# Altium schematic symbol library Analog Devices Data Converters Digital-to-Analog Converters.SchLib: 2231 symbols (part 132 of 135) (continued)
## DAC08EQ (continued)

## DAC08ES
designator U?
Single 8-Bit Multiplying Digital-to-Analog Converter with Universal Digital Logic Interface, 0 to +70 degC, R-16, Tube; Generic Part Number: DAC08; Manufacturer: Analog Devices; PartNumber: DAC08ES; # DAC Outputs: 1; Max V+: 18V; Op Pwr Diss: 33mW; Resolution (Bits): 8; Settling Time: 85ns; Single Supply: No; DatasheetVersion: Rev.C; PackageVersion: 060606-A; PackageReference: R-16; PackageDescription: 16-Lead Standard Small Outline Package [SOIC_N] Narrow Body; Supplier 1: Digi-Key; Supplier Part Number 1: DAC08ES-ND; Supplier 2: Mouser; Supplier Part Number 2: 584-DAC08ES; Packing: Tube; RoHS: N; Mounting Technology: Surface Mount; Code_JEDEC: MS-012-AC; ComponentLink1Description: Manufacturer URL; ComponentLink1URL: http://www.analog.com/en/index.html; ComponentLink2Description: Datasheet; ComponentLink2URL: http://www.analog.com/static/imported-files/data_sheets/DAC08.pdf; ComponentLink3Description: Package Specification; ComponentLink3URL: http://www.analog.com/static/imported-files/packages/PKG_PDF/SOIC_Narrow%20(R)/R_16.pdf; ComponentLink4Description: Product URL; ComponentLink4URL: http://www.analog.com/en/digital-to-analog-converters/da-converters/dac08/products/product.html
footprint R-16_N (SOIC, 16-Leads, Body 9.9x3.9mm, Pitch 1.27mm, IPC Medium Density)
footprint R-16_L (SOIC, 16-Leads, Body 9.9x3.9mm, Pitch 1.27mm, IPC High Density)
footprint R-16_M (SOIC, 16-Leads, Body 9.9x3.9mm, Pitch 1.27mm, IPC Low Density)
pins: 1 V+ (power), 2 VREF(+) (in), 3 VREF(-) (in), 4 COMP, 5 VLC (in), 6 ~{IOUT}, 7 V- (power), 8 IOUT (out), 9 B1(MSB) (in), 10 B2 (in), 11 B3 (in), 12 B4 (in), 13 B5 (in), 14 B6 (in), 15 B7 (in), 16 B8(LSB) (in)

## DAC08ESZ
designator U?
Single 8-Bit Multiplying Digital-to-Analog Converter with Universal Digital Logic Interface, 0 to +70 degC, R-16, Pb-Free, Tube; Generic Part Number: DAC08; Manufacturer: Analog Devices; PartNumber: DAC08ESZ; # DAC Outputs: 1; Max V+: 18V; Op Pwr Diss: 33mW; Resolution (Bits): 8; Settling Time: 85ns; Single Supply: No; DatasheetVersion: Rev.C; PackageVersion: 060606-A; PackageReference: R-16; PackageDescription: 16-Lead Standard Small Outline Package [SOIC_N] Narrow Body; Supplier 1: Digi-Key; Supplier Part Number 1: DAC08ESZ-ND; Supplier 2: Newark; Supplier Part Number 2: 59K7902; Supplier 3: Mouser; Supplier Part Number 3: 584-DAC08ESZ; Packing: Tube; RoHS: Y; Mounting Technology: Surface Mount; Code_JEDEC: MS-012-AC; ComponentLink1Description: Manufacturer URL; ComponentLink1URL: http://www.analog.com/en/index.html; ComponentLink2Description: Datasheet; ComponentLink2URL: http://www.analog.com/static/imported-files/data_sheets/DAC08.pdf; ComponentLink3Description: Package Specification; ComponentLink3URL: http://www.analog.com/static/imported-files/packages/PKG_PDF/SOIC_Narrow%20(R)/R_16.pdf; ComponentLink4Description: Product URL; ComponentLink4URL: http://www.analog.com/en/digital-to-analog-converters/da-converters/dac08/products/product.html
footprint R-16_N (SOIC, 16-Leads, Body 9.9x3.9mm, Pitch 1.27mm, IPC Medium Density)
footprint R-16_L (SOIC, 16-Leads, Body 9.9x3.9mm, Pitch 1.27mm, IPC High Density)
footprint R-16_M (SOIC, 16-Leads, Body 9.9x3.9mm, Pitch 1.27mm, IPC Low Density)
pins: 1 V+ (power), 2 VREF(+) (in), 3 VREF(-) (in), 4 COMP, 5 VLC (in), 6 ~{IOUT}, 7 V- (power), 8 IOUT (out), 9 B1(MSB) (in), 10 B2 (in), 11 B3 (in), 12 B4 (in), 13 B5 (in), 14 B6 (in), 15 B7 (in), 16 B8(LSB) (in)

## DAC08ESZ-REEL
designator U?
Single 8-Bit Multiplying Digital-to-Analog Converter with Universal Digital Logic Interface, 0 to +70 degC, R-16, Pb-Free, Reel; Generic Part Number: DAC08; Manufacturer: Analog Devices; PartNumber: DAC08ESZ-REEL; # DAC Outputs: 1; Max V+: 18V; Op Pwr Diss: 33mW; Resolution (Bits): 8; Settling Time: 85ns; Single Supply: No; DatasheetVersion: Rev.C; PackageVersion: 060606-A; PackageReference: R-16; PackageDescription: 16-Lead Standard Small Outline Package [SOIC_N] Narrow Body; Supplier 1: Digi-Key; Supplier Part Number 1: DAC08ESZ-REEL-ND; Supplier 2: Newark; Supplier Part Number 2: 59K7903; Supplier 3: Mouser; Supplier Part Number 3: 584-DAC08ESZ-R; Packing: Reel; RoHS: Y; Mounting Technology: Surface Mount; Code_JEDEC: MS-012-AC; ComponentLink1Description: Manufacturer URL; ComponentLink1URL: http://www.analog.com/en/index.html; ComponentLink2Description: Datasheet; ComponentLink2URL: http://www.analog.com/static/imported-files/data_sheets/DAC08.pdf; ComponentLink3Description: Package Specification; ComponentLink3URL: http://www.analog.com/static/imported-files/packages/PKG_PDF/SOIC_Narrow%20(R)/R_16.pdf; ComponentLink4Description: Product URL; ComponentLink4URL: http://www.analog.com/en/digital-to-analog-converters/da-converters/dac08/products/product.html
footprint R-16_N (SOIC, 16-Leads, Body 9.9x3.9mm, Pitch 1.27mm, IPC Medium Density)
footprint R-16_L (SOIC, 16-Leads, Body 9.9x3.9mm, Pitch 1.27mm, IPC High Density)
footprint R-16_M (SOIC, 16-Leads, Body 9.9x3.9mm, Pitch 1.27mm, IPC Low Density)
pins: 1 V+ (power), 2 VREF(+) (in), 3 VREF(-) (in), 4 COMP, 5 VLC (in), 6 ~{IOUT}, 7 V- (power), 8 IOUT (out), 9 B1(MSB) (in), 10 B2 (in), 11 B3 (in), 12 B4 (in), 13 B5 (in), 14 B6 (in), 15 B7 (in), 16 B8(LSB) (in)

## DAC08HQ
designator U?
Single 8-Bit Multiplying Digital-to-Analog Converter with Universal Digital Logic Interface, 0 to +70 degC, Q-16, Tube; Generic Part Number: DAC08; Manufacturer: Analog Devices; PartNumber: DAC08HQ; # DAC Outputs: 1; Max V+: 18V; Op Pwr Diss: 33mW; Resolution (Bits): 8; Settling Time: 85ns; Single Supply: No; DatasheetVersion: Rev.C; PackageVersion: 1996; PackageReference: Q-16; PackageDescription: DIP, 16-Pin, Skinny Dual In-line Package, 300mil Wide, Pitch 2.54 mm; Supplier 1: Digi-Key; Supplier Part Number 1: DAC08HQ-ND; Supplier 2: Newark; Supplier Part Number 2: 05F7959; Supplier 3: Mouser; Supplier Part Number 3: 584-DAC08HQ; Packing: Tube; RoHS: N; Mounting Technology: Through Hole; ComponentLink1Description: Manufacturer URL; ComponentLink1URL: http://www.analog.com/en/index.html; ComponentLink2Description: Datasheet; ComponentLink2URL: http://www.analog.com/static/imported-files/data_sheets/DAC08.pdf; ComponentLink3Description: Package Specification; ComponentLink3URL: http://www.analog.com/static/imported-files/packages/54083157002221Q_16.pdf; ComponentLink4Description: Product URL; ComponentLink4URL: http://www.analog.com/en/digital-to-analog-converters/da-converters/dac08/products/product.html
footprint Q-16 (DIP, 16-Leads, Row Spacing 7.62mm, Pitch 2.54mm, Body 20.07x6.73mm)
pins: 1 VLC (in), 2 ~{IOUT}, 3 V- (power), 4 IOUT (out), 5 (MSB) B1 (in), 6 B2 (in), 7 B3 (in), 8 B4 (in), 9 B5 (in), 10 B6 (in), 11 B7 (in), 12 B8 (LSB) (in), 13 V+ (power), 14 VREF (+) (in), 15 VREF (-) (in), 16 COMP

## DAC08Q
designator U?
Single 8-Bit Multiplying Digital-to-Analog Converter with Universal Digital Logic Interface, -55 to +125 degC, Q-16, Tube; Generic Part Number: DAC08; Manufacturer: Analog Devices; PartNumber: DAC08Q; # DAC Outputs: 1; Max V+: 18V; Op Pwr Diss: 33mW; Resolution (Bits): 8; Settling Time: 85ns; Single Supply: No; DatasheetVersion: Rev.C; PackageVersion: 1996; PackageReference: Q-16; PackageDescription: DIP, 16-Pin, Skinny Dual In-line Package, 300mil Wide, Pitch 2.54 mm; Supplier 1: Digi-Key; Supplier Part Number 1: DAC08Q-ND; Supplier 2: Newark; Supplier Part Number 2: 09B8112; Supplier 3: Mouser; Supplier Part Number 3: 584-DAC08Q; Packing: Tube; RoHS: N; Mounting Technology: Through Hole; ComponentLink1Description: Manufacturer URL; ComponentLink1URL: http://www.analog.com/en/index.html; ComponentLink2Description: Datasheet; ComponentLink2URL: http://www.analog.com/static/imported-files/data_sheets/DAC08.pdf; ComponentLink3Description: Package Specification; ComponentLink3URL: http://www.analog.com/static/imported-files/packages/54083157002221Q_16.pdf; ComponentLink4Description: Product URL; ComponentLink4URL: http://www.analog.com/en/digital-to-analog-converters/da-converters/dac08/products/product.html
footprint Q-16 (DIP, 16-Leads, Row Spacing 7.62mm, Pitch 2.54mm, Body 20.07x6.73mm)
pins: 1 VLC (in), 2 ~{IOUT}, 3 V- (power), 4 IOUT (out), 5 (MSB) B1 (in), 6 B2 (in), 7 B3 (in), 8 B4 (in), 9 B5 (in), 10 B6 (in), 11 B7 (in), 12 B8 (LSB) (in), 13 V+ (power), 14 VREF (+) (in), 15 VREF (-) (in), 16 COMP

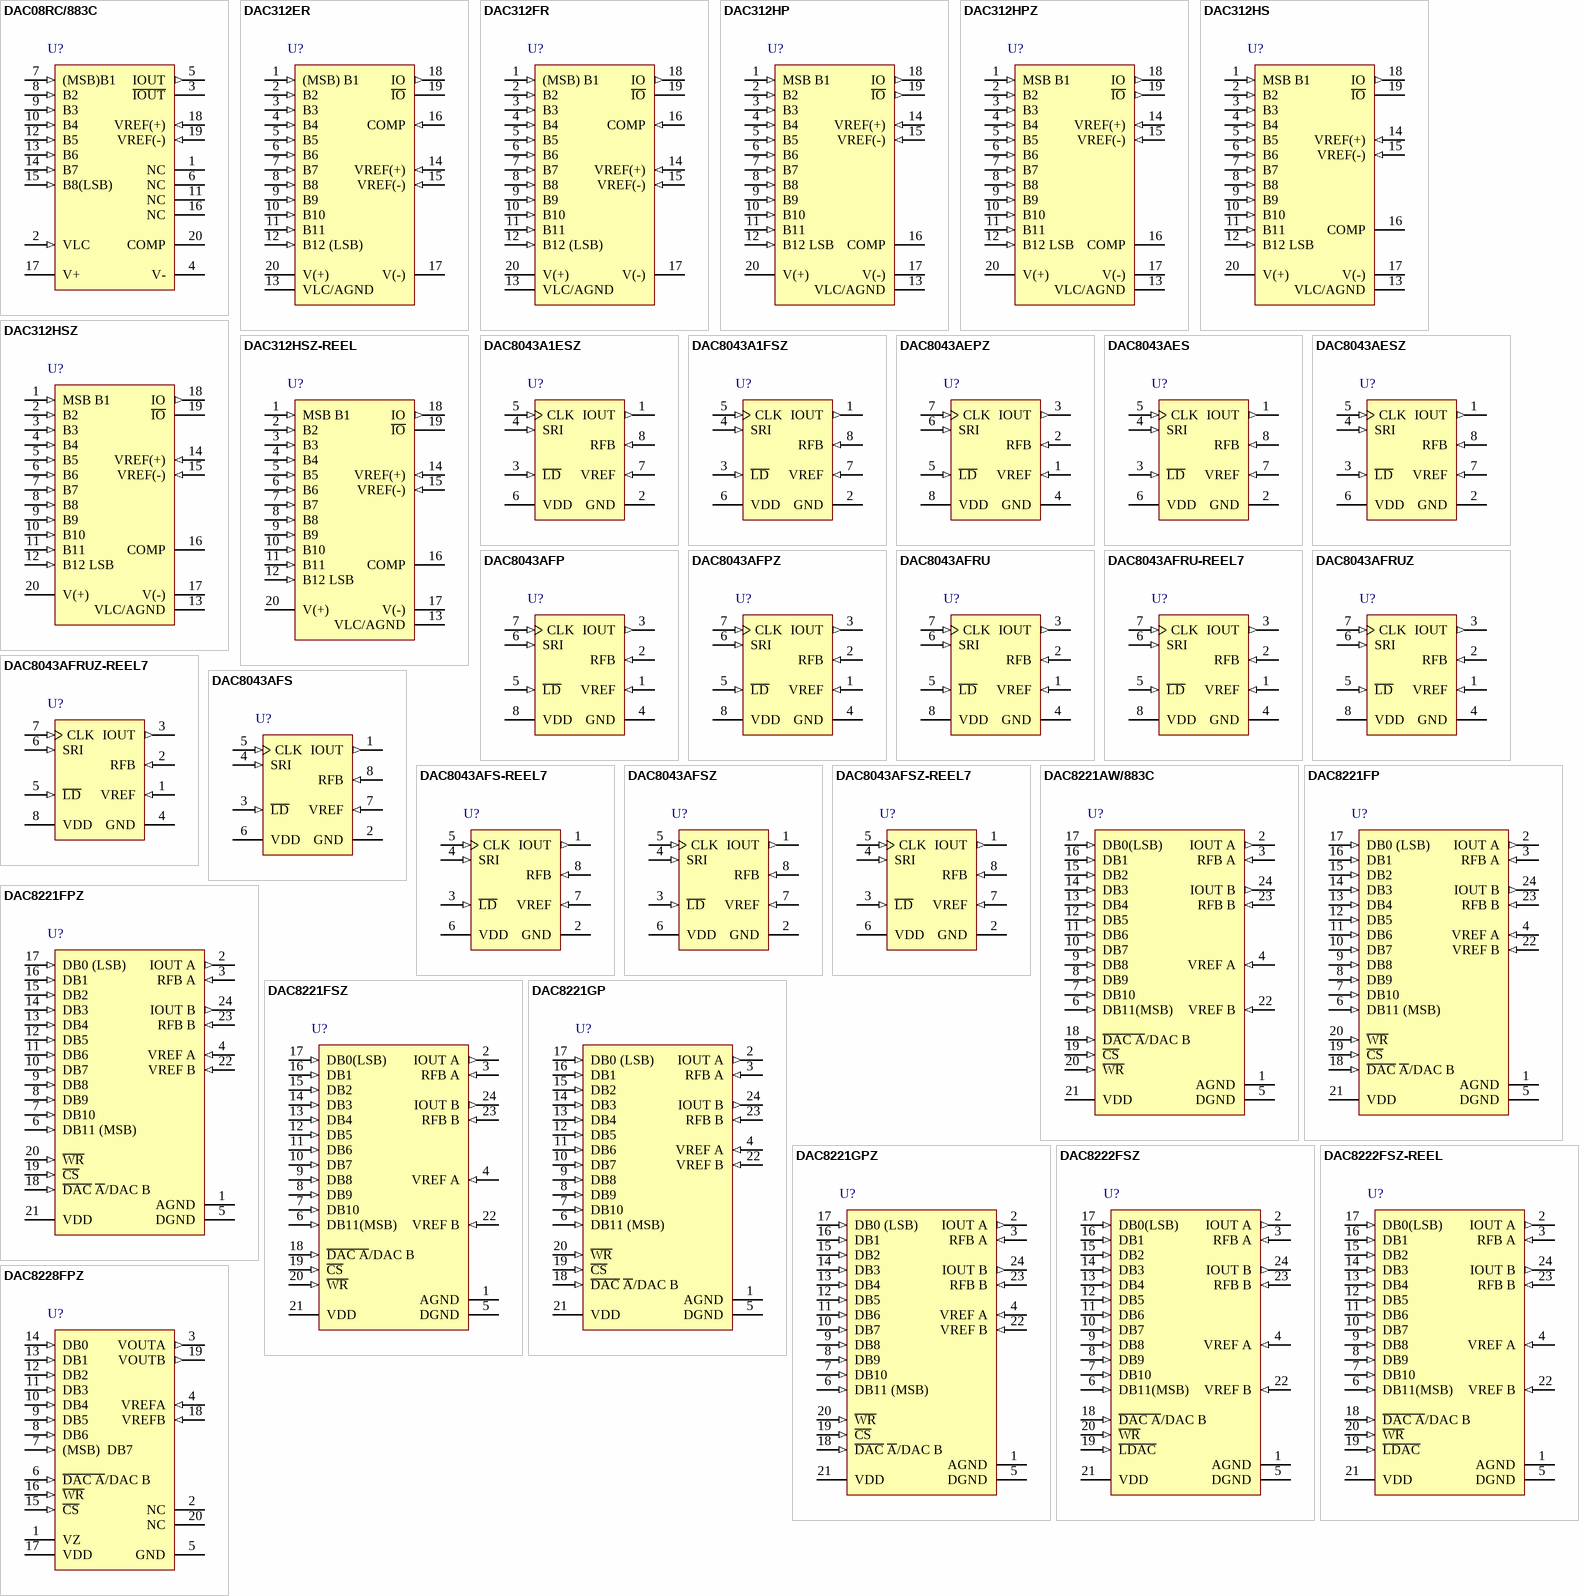
[diagram p110: symbols DAC08RC/883C to DAC8228FPZ]

## DAC08RC/883C
designator U?
Single 8-Bit Multiplying Digital-to-Analog Converter with Universal Digital Logic Interface, -55 to +125 degC, E-20-1, Tube; Generic Part Number: DAC08; Manufacturer: Analog Devices; PartNumber: DAC08RC/883C; # DAC Outputs: 1; Max V+: 18V; Op Pwr Diss: 33mW; Resolution (Bits): 8; Settling Time: 85ns; Single Supply: No; DatasheetVersion: Rev.C; PackageVersion: 022106-A; PackageReference: E-20-1; PackageDescription: 20-Terminal Ceramic Leadless Chip Carrier [LCC]; Supplier 1: Mouser; Supplier Part Number 1: 584-DAC08RC883C; Packing: Tube; RoHS: N; Mounting Technology: Surface Mount; ComponentLink1Description: Manufacturer URL; ComponentLink1URL: http://www.analog.com/en/index.html; ComponentLink2Description: Datasheet; ComponentLink2URL: http://www.analog.com/static/imported-files/data_sheets/DAC08.pdf; ComponentLink3Description: Package Specification; ComponentLink3URL: http://www.analog.com/static/imported-files/packages/PKG_PDF/LCC(E)/E_20_1.pdf; ComponentLink4Description: Product URL; ComponentLink4URL: http://www.analog.com/en/digital-to-analog-converters/da-converters/dac08/products/product.html
footprint E-20-1_N (Leadless Chip Carrier, 20-Leads, Body 8.9x8.9mm, Pitch 1.27mm, IPC Medium Density)
footprint E-20-1_L (Leadless Chip Carrier, 20-Leads, Body 8.9x8.9mm, Pitch 1.27mm, IPC High Density)
footprint E-20-1_M (Leadless Chip Carrier, 20-Leads, Body 8.9x8.9mm, Pitch 1.27mm, IPC Low Density)
pins: 1 NC, 2 VLC (in), 3 ~{IOUT}, 4 V- (power), 5 IOUT (out), 6 NC, 7 (MSB)B1 (in), 8 B2 (in), 9 B3 (in), 10 B4 (in), 11 NC, 12 B5 (in), 13 B6 (in), 14 B7 (in), 15 B8(LSB) (in), 16 NC, 17 V+ (power), 18 VREF(+) (in), 19 VREF(-) (in), 20 COMP

## DAC312ER
designator U?
Single 12-Bit High Speed Multiplying Digital-to-Analog Converter, 0 to +70 degC, Q-20, Tube; Generic Part Number: DAC312; Manufacturer: Analog Devices; PartNumber: DAC312ER; # DAC Outputs: 1; Max V+: 18V; Op Pwr Diss: 267mW; Resolution (Bits): 12; Settling Time: 250ns; Single Supply: No; DatasheetVersion: Rev.C; PackageVersion: Dec-2004; PackageReference: Q-20; PackageDescription: 20-Lead Ceramic Dual In-Line Package [CERDIP]; Supplier 1: Digi-Key; Supplier Part Number 1: DAC312ER-ND; Supplier 2: Mouser; Supplier Part Number 2: 584-DAC312ER; Packing: Tube; RoHS: N; Mounting Technology: Through Hole; ComponentLink1Description: Manufacturer URL; ComponentLink1URL: http://www.analog.com/en/index.html; ComponentLink2Description: Datasheet; ComponentLink2URL: http://www.analog.com/static/imported-files/data_sheets/DAC312.pdf; ComponentLink3Description: Package Specification; ComponentLink3URL: http://www.analog.com/static/imported-files/packages/50516416473314Q_20.pdf; ComponentLink4Description: Product URL; ComponentLink4URL: http://www.analog.com/en/digital-to-analog-converters/da-converters/dac312/products/product.html
footprint Q-20 (DIP, 20-Leads, Row Spacing 7.62mm, Pitch 2.54mm, Body 25.9x6.7mm)
pins: 1 (MSB) B1 (in), 2 B2 (in), 3 B3 (in), 4 B4 (in), 5 B5 (in), 6 B6 (in), 7 B7 (in), 8 B8 (in), 9 B9 (in), 10 B10 (in), 11 B11 (in), 12 B12 (LSB) (in), 13 VLC/AGND (power), 14 VREF(+) (in), 15 VREF(-) (in), 16 COMP (in), 17 V(-) (power), 18 IO (out), 19 ~{IO}, 20 V(+) (power)

## DAC312FR
designator U?
Single 12-Bit High Speed Multiplying Digital-to-Analog Converter, -40 to +85 degC, Q-20, Tube; Generic Part Number: DAC312; Manufacturer: Analog Devices; PartNumber: DAC312FR; # DAC Outputs: 1; Max V+: 18V; Op Pwr Diss: 267mW; Resolution (Bits): 12; Settling Time: 250ns; Single Supply: No; DatasheetVersion: Rev.C; PackageVersion: Dec-2004; PackageReference: Q-20; PackageDescription: 20-Lead Ceramic Dual In-Line Package [CERDIP]; Supplier 1: Digi-Key; Supplier Part Number 1: DAC312FR-ND; Supplier 2: Newark; Supplier Part Number 2: 05F7976; Supplier 3: Mouser; Supplier Part Number 3: 584-DAC312FR; Packing: Tube; RoHS: N; Mounting Technology: Through Hole; ComponentLink1Description: Manufacturer URL; ComponentLink1URL: http://www.analog.com/en/index.html; ComponentLink2Description: Datasheet; ComponentLink2URL: http://www.analog.com/static/imported-files/data_sheets/DAC312.pdf; ComponentLink3Description: Package Specification; ComponentLink3URL: http://www.analog.com/static/imported-files/packages/50516416473314Q_20.pdf; ComponentLink4Description: Product URL; ComponentLink4URL: http://www.analog.com/en/digital-to-analog-converters/da-converters/dac312/products/product.html
footprint Q-20 (DIP, 20-Leads, Row Spacing 7.62mm, Pitch 2.54mm, Body 25.9x6.7mm)
pins: 1 (MSB) B1 (in), 2 B2 (in), 3 B3 (in), 4 B4 (in), 5 B5 (in), 6 B6 (in), 7 B7 (in), 8 B8 (in), 9 B9 (in), 10 B10 (in), 11 B11 (in), 12 B12 (LSB) (in), 13 VLC/AGND (power), 14 VREF(+) (in), 15 VREF(-) (in), 16 COMP (in), 17 V(-) (power), 18 IO (out), 19 ~{IO}, 20 V(+) (power)

## DAC312HP
designator U?
Single 12-Bit Multiplying Digital-to-Analog Converter, -40 to +85 degC, N-20, Tube; Generic Part Number: DAC312; Manufacturer: Analog Devices; PartNumber: DAC312HP; # DAC Outputs: 1; Max V+: 18V; Op Pwr Diss: 267mW; Resolution (Bits): 12; Settling Time: 250ns; Single Supply: No; DatasheetVersion: Rev.C; PackageVersion: 070706-A; PackageReference: N-20; PackageDescription: 20-Lead Plastic Dual In-Line Package [PDIP] Narrow Body; Supplier 1: Digi-Key; Supplier Part Number 1: DAC312HP-ND; Supplier 2: Mouser; Supplier Part Number 2: 584-DAC312HP; Packing: Tube; RoHS: N; Mounting Technology: Through Hole; Code_JEDEC: MS-001; ComponentLink1Description: Manufacturer URL; ComponentLink1URL: http://www.analog.com/en/index.html; ComponentLink2Description: Datasheet; ComponentLink2URL: http://www.analog.com/static/imported-files/data_sheets/DAC312.pdf; ComponentLink3Description: Package Specification; ComponentLink3URL: http://www.analog.com/static/imported-files/packages/50601349676519N_20.pdf; ComponentLink4Description: Product URL; ComponentLink4URL: http://www.analog.com/en/digital-to-analog-converters/da-converters/dac312/products/product.html
footprint N-20 (DIP, 20-Leads, Row Spacing 7.62mm, Pitch 2.54mm, Body 25.9x6.6mm)
pins: 1 MSB B1 (in), 2 B2 (in), 3 B3 (in), 4 B4 (in), 5 B5 (in), 6 B6 (in), 7 B7 (in), 8 B8 (in), 9 B9 (in), 10 B10 (in), 11 B11 (in), 12 B12 LSB (in), 13 VLC/AGND (power), 14 VREF(+) (in), 15 VREF(-) (in), 16 COMP, 17 V(-) (power), 18 IO (out), 19 ~{IO} (out), 20 V(+) (power)

## DAC312HPZ
designator U?
Single 12-Bit Multiplying Digital-to-Analog Converter, -40 to +85 degC, N-20, Pb-Free, Tube; Generic Part Number: DAC312; Manufacturer: Analog Devices; PartNumber: DAC312HPZ; # DAC Outputs: 1; Max V+: 18V; Op Pwr Diss: 267mW; Resolution (Bits): 12; Settling Time: 250ns; Single Supply: No; DatasheetVersion: Rev.C; PackageVersion: 070706-A; PackageReference: N-20; PackageDescription: 20-Lead Plastic Dual In-Line Package [PDIP] Narrow Body; Supplier 1: Digi-Key; Supplier Part Number 1: DAC312HPZ-ND; Supplier 2: Newark; Supplier Part Number 2: 14M1925; Supplier 3: Mouser; Supplier Part Number 3: 584-DAC312HPZ; Packing: Tube; RoHS: Y; Mounting Technology: Through Hole; Code_JEDEC: MS-001; ComponentLink1Description: Manufacturer URL; ComponentLink1URL: http://www.analog.com/en/index.html; ComponentLink2Description: Datasheet; ComponentLink2URL: http://www.analog.com/static/imported-files/data_sheets/DAC312.pdf; ComponentLink3Description: Package Specification; ComponentLink3URL: http://www.analog.com/static/imported-files/packages/50601349676519N_20.pdf; ComponentLink4Description: Product URL; ComponentLink4URL: http://www.analog.com/en/digital-to-analog-converters/da-converters/dac312/products/product.html
footprint N-20 (DIP, 20-Leads, Row Spacing 7.62mm, Pitch 2.54mm, Body 25.9x6.6mm)
pins: 1 MSB B1 (in), 2 B2 (in), 3 B3 (in), 4 B4 (in), 5 B5 (in), 6 B6 (in), 7 B7 (in), 8 B8 (in), 9 B9 (in), 10 B10 (in), 11 B11 (in), 12 B12 LSB (in), 13 VLC/AGND (power), 14 VREF(+) (in), 15 VREF(-) (in), 16 COMP, 17 V(-) (power), 18 IO (out), 19 ~{IO} (out), 20 V(+) (power)

## DAC312HS
designator U?
Single 12-Bit Multiplying Digital-to-Analog Converter, -40 to +85 degC, RW-20, Tube; Generic Part Number: DAC312; Manufacturer: Analog Devices; PartNumber: DAC312HS; # DAC Outputs: 1; Max V+: 18V; Op Pwr Diss: 267mW; Resolution (Bits): 12; Settling Time: 250ns; Single Supply: No; DatasheetVersion: Rev.C; PackageVersion: 060706-A; PackageReference: RW-20; PackageDescription: 20-Lead Standard Small Outline Package [SOIC_W] Wide Body; Supplier 1: Digi-Key; Supplier Part Number 1: DAC312HS-ND; Supplier 2: Mouser; Supplier Part Number 2: 584-DAC312HS; Packing: Tube; RoHS: N; Mounting Technology: Surface Mount; Code_JEDEC: MS-013-AC; ComponentLink1Description: Manufacturer URL; ComponentLink1URL: http://www.analog.com/en/index.html; ComponentLink2Description: Datasheet; ComponentLink2URL: http://www.analog.com/static/imported-files/data_sheets/DAC312.pdf; ComponentLink3Description: Package Specification; ComponentLink3URL: http://www.analog.com/static/imported-files/packages/233848RW_20.pdf; ComponentLink4Description: Product URL; ComponentLink4URL: http://www.analog.com/en/digital-to-analog-converters/da-converters/dac312/products/product.html
footprint RW-20_N (SOIC, 20-Leads, Body 12.8x7.5mm, Pitch 1.27mm, IPC Medium Density)
footprint RW-20_L (SOIC, 20-Leads, Body 12.8x7.5mm, Pitch 1.27mm, IPC High Density)
footprint RW-20_M (SOIC, 20-Leads, Body 12.8x7.5mm, Pitch 1.27mm, IPC Low Density)
pins: 1 MSB B1 (in), 2 B2 (in), 3 B3 (in), 4 B4 (in), 5 B5 (in), 6 B6 (in), 7 B7 (in), 8 B8 (in), 9 B9 (in), 10 B10 (in), 11 B11 (in), 12 B12 LSB (in), 13 VLC/AGND (power), 14 VREF(+) (in), 15 VREF(-) (in), 16 COMP, 17 V(-) (power), 18 IO (out), 19 ~{IO}, 20 V(+) (power)

## DAC312HSZ
designator U?
Single 12-Bit Multiplying Digital-to-Analog Converter, -40 to +85 degC, RW-20, Pb-Free, Tube; Generic Part Number: DAC312; Manufacturer: Analog Devices; PartNumber: DAC312HSZ; # DAC Outputs: 1; Max V+: 18V; Op Pwr Diss: 267mW; Resolution (Bits): 12; Settling Time: 250ns; Single Supply: No; DatasheetVersion: Rev.C; PackageVersion: 060706-A; PackageReference: RW-20; PackageDescription: 20-Lead Standard Small Outline Package [SOIC_W] Wide Body; Supplier 1: Digi-Key; Supplier Part Number 1: DAC312HSZ-ND; Supplier 2: Newark; Supplier Part Number 2: 59K7909; Supplier 3: Mouser; Supplier Part Number 3: 584-DAC312HSZ; Packing: Tube; RoHS: Y; Mounting Technology: Surface Mount; Code_JEDEC: MS-013-AC; ComponentLink1Description: Manufacturer URL; ComponentLink1URL: http://www.analog.com/en/index.html; ComponentLink2Description: Datasheet; ComponentLink2URL: http://www.analog.com/static/imported-files/data_sheets/DAC312.pdf; ComponentLink3Description: Package Specification; ComponentLink3URL: http://www.analog.com/static/imported-files/packages/233848RW_20.pdf; ComponentLink4Description: Product URL; ComponentLink4URL: http://www.analog.com/en/digital-to-analog-converters/da-converters/dac312/products/product.html
footprint RW-20_N (SOIC, 20-Leads, Body 12.8x7.5mm, Pitch 1.27mm, IPC Medium Density)
footprint RW-20_L (SOIC, 20-Leads, Body 12.8x7.5mm, Pitch 1.27mm, IPC High Density)
footprint RW-20_M (SOIC, 20-Leads, Body 12.8x7.5mm, Pitch 1.27mm, IPC Low Density)
pins: 1 MSB B1 (in), 2 B2 (in), 3 B3 (in), 4 B4 (in), 5 B5 (in), 6 B6 (in), 7 B7 (in), 8 B8 (in), 9 B9 (in), 10 B10 (in), 11 B11 (in), 12 B12 LSB (in), 13 VLC/AGND (power), 14 VREF(+) (in), 15 VREF(-) (in), 16 COMP, 17 V(-) (power), 18 IO (out), 19 ~{IO}, 20 V(+) (power)

## DAC312HSZ-REEL
designator U?
Single 12-Bit Multiplying Digital-to-Analog Converter, 0 to +70 degC, RW-20, Pb-Free, Reel; Generic Part Number: DAC312; Manufacturer: Analog Devices; PartNumber: DAC312HSZ-REEL; # DAC Outputs: 1; Max V+: 18V; Op Pwr Diss: 267mW; Resolution (Bits): 12; Settling Time: 250ns; Single Supply: No; DatasheetVersion: Rev.C; PackageVersion: 060706-A; PackageReference: RW-20; PackageDescription: 20-Lead Standard Small Outline Package [SOIC_W] Wide Body; Supplier 1: Digi-Key; Supplier Part Number 1: DAC312HSZ-REEL-ND; Supplier 2: Mouser; Supplier Part Number 2: 584-DAC312HSZ-R; Packing: Reel; RoHS: Y; Mounting Technology: Surface Mount; Code_JEDEC: MS-013-AC; ComponentLink1Description: Manufacturer URL; ComponentLink1URL: http://www.analog.com/en/index.html; ComponentLink2Description: Datasheet; ComponentLink2URL: http://www.analog.com/static/imported-files/data_sheets/DAC312.pdf; ComponentLink3Description: Package Specification; ComponentLink3URL: http://www.analog.com/static/imported-files/packages/233848RW_20.pdf; ComponentLink4Description: Product URL; ComponentLink4URL: http://www.analog.com/en/digital-to-analog-converters/da-converters/dac312/products/product.html
footprint RW-20_N (SOIC, 20-Leads, Body 12.8x7.5mm, Pitch 1.27mm, IPC Medium Density)
footprint RW-20_L (SOIC, 20-Leads, Body 12.8x7.5mm, Pitch 1.27mm, IPC High Density)
footprint RW-20_M (SOIC, 20-Leads, Body 12.8x7.5mm, Pitch 1.27mm, IPC Low Density)
pins: 1 MSB B1 (in), 2 B2 (in), 3 B3 (in), 4 B4 (in), 5 B5 (in), 6 B6 (in), 7 B7 (in), 8 B8 (in), 9 B9 (in), 10 B10 (in), 11 B11 (in), 12 B12 LSB (in), 13 VLC/AGND (power), 14 VREF(+) (in), 15 VREF(-) (in), 16 COMP, 17 V(-) (power), 18 IO (out), 19 ~{IO}, 20 V(+) (power)

## DAC8043A1ESZ
designator U?
Single 12-Bit Multiplying Digital-to-Analog Converter with Serial Interface, -40 to +85 degC, R-8, Pb-Free, Tube; Generic Part Number: DAC8043A; Manufacturer: Analog Devices; PartNumber: DAC8043A1ESZ; # DAC Outputs: 1; Max V+: 5.5V; Op Pwr Diss: 50µW; Resolution (Bits): 12; Settling Time: 250ns; Single Supply: Yes; DatasheetVersion: Rev.B; PackageVersion: 060506-A; PackageReference: R-8; PackageDescription: 8-Lead Standard Small Outline Package [SOIC_N] Narrow Body; Supplier 1: Digi-Key; Supplier Part Number 1: DAC8043A1ESZ-ND; Supplier 2: Mouser; Supplier Part Number 2: 584-DAC8043A1ESZ; Packing: Tube; RoHS: Y; Mounting Technology: Surface Mount; Code_JEDEC: MS-012-AA; Code_IPC: SOIC127P600-8; ComponentLink1Description: Manufacturer URL; ComponentLink1URL: http://www.analog.com/en/index.html; ComponentLink2Description: Datasheet; ComponentLink2URL: http://www.analog.com/static/imported-files/data_sheets/DAC8043A.pdf; ComponentLink3Description: Package Specification; ComponentLink3URL: http://www.analog.com/static/imported-files/packages/PKG_PDF/SOIC_Narrow%20(R)/R_8.pdf; ComponentLink4Description: Product URL; ComponentLink4URL: http://www.analog.com/en/digital-to-analog-converters/da-converters/dac8043a/products/product.html
footprint R-8_N (SOIC, 8-Leads, Body 4.9x3.9mm, Pitch 1.27mm, IPC Medium Density)
footprint R-8_L (SOIC, 8-Leads, Body 4.9x3.9mm, Pitch 1.27mm, IPC High Density)
footprint R-8_M (SOIC, 8-Leads, Body 4.9x3.9mm, Pitch 1.27mm, IPC Low Density)
pins: 1 IOUT (out) "DAC Current Output, full-scale output 1 LSB less than reference input voltage -VREF.", 2 GND (power) "Analog and Digital Ground.", 3 ~{LD} (in) "Load Strobe, Level-Sensitive Digital Input.Transfers shift-register data to DAC register while active low. See truth table for operation.", 4 SRI (in) "12-Bit Serial Register Input, data loads directly into the shift register MSB first. Extra leading bits are ignored.", 5 CLK (in) "Clock Input, positive-edge clocks data into shift register.", 6 VDD (power) "Positive Power Supply Input. Specified range of operation 5V +/- 10%.", 7 VREF (in) "DAC Reference Input Pin. Establishes DAC fullscale voltage. Constant input resistance versus code.", 8 RFB (in) "Internal Matching Feedback Resistor. Connect to external op amp output."

## DAC8043A1FSZ
designator U?
Single 12-Bit Multiplying Digital-to-Analog Converter with Serial Interface, -40 to +85 degC, R-8, Pb-Free, Tube; Generic Part Number: DAC8043A; Manufacturer: Analog Devices; PartNumber: DAC8043A1FSZ; # DAC Outputs: 1; Max V+: 5.5V; Op Pwr Diss: 50µW; Resolution (Bits): 12; Settling Time: 250ns; Single Supply: Yes; DatasheetVersion: Rev.B; PackageVersion: 060506-A; PackageReference: R-8; PackageDescription: 8-Lead Standard Small Outline Package [SOIC_N] Narrow Body; Supplier 1: Digi-Key; Supplier Part Number 1: DAC8043A1FSZ-ND; Supplier 2: Mouser; Supplier Part Number 2: 584-DAC8043A1FSZ; Packing: Tube; RoHS: Y; Mounting Technology: Surface Mount; Code_JEDEC: MS-012-AA; Code_IPC: SOIC127P600-8; ComponentLink1Description: Manufacturer URL; ComponentLink1URL: http://www.analog.com/en/index.html; ComponentLink2Description: Datasheet; ComponentLink2URL: http://www.analog.com/static/imported-files/data_sheets/DAC8043A.pdf; ComponentLink3Description: Package Specification; ComponentLink3URL: http://www.analog.com/static/imported-files/packages/PKG_PDF/SOIC_Narrow%20(R)/R_8.pdf; ComponentLink4Description: Product URL; ComponentLink4URL: http://www.analog.com/en/digital-to-analog-converters/da-converters/dac8043a/products/product.html
footprint R-8_N (SOIC, 8-Leads, Body 4.9x3.9mm, Pitch 1.27mm, IPC Medium Density)
footprint R-8_L (SOIC, 8-Leads, Body 4.9x3.9mm, Pitch 1.27mm, IPC High Density)
footprint R-8_M (SOIC, 8-Leads, Body 4.9x3.9mm, Pitch 1.27mm, IPC Low Density)
pins: 1 IOUT (out) "DAC Current Output, full-scale output 1 LSB less than reference input voltage -VREF.", 2 GND (power) "Analog and Digital Ground.", 3 ~{LD} (in) "Load Strobe, Level-Sensitive Digital Input.Transfers shift-register data to DAC register while active low. See truth table for operation.", 4 SRI (in) "12-Bit Serial Register Input, data loads directly into the shift register MSB first. Extra leading bits are ignored.", 5 CLK (in) "Clock Input, positive-edge clocks data into shift register.", 6 VDD (power) "Positive Power Supply Input. Specified range of operation 5V +/- 10%.", 7 VREF (in) "DAC Reference Input Pin. Establishes DAC fullscale voltage. Constant input resistance versus code.", 8 RFB (in) "Internal Matching Feedback Resistor. Connect to external op amp output."

## DAC8043AEPZ
designator U?
Single 12-Bit Multiplying Digital-to-Analog Converter with Serial Interface, -40 to +85 degC, N-8, Pb-Free, Tube; Generic Part Number: DAC8043A; Manufacturer: Analog Devices; PartNumber: DAC8043AEPZ; # DAC Outputs: 1; Max V+: 5.5V; Op Pwr Diss: 50µW; Resolution (Bits): 12; Settling Time: 250ns; Single Supply: Yes; DatasheetVersion: Rev.B; PackageVersion: 070606-A; PackageReference: N-8; PackageDescription: 8-Lead Plastic Dual In-Line Package [PDIP] Narrow Body; Supplier 1: Digi-Key; Supplier Part Number 1: DAC8043AEPZ-ND; Supplier 2: Mouser; Supplier Part Number 2: 584-DAC8043AEPZ; Packing: Tube; RoHS: Y; Mounting Technology: Through Hole; Code_JEDEC: MS-001; ComponentLink1Description: Manufacturer URL; ComponentLink1URL: http://www.analog.com/en/index.html; ComponentLink2Description: Datasheet; ComponentLink2URL: http://www.analog.com/static/imported-files/data_sheets/DAC8043A.pdf; ComponentLink3Description: Package Specification; ComponentLink3URL: http://www.analog.com/static/imported-files/packages/PKG_PDF/PDIP(N)/N_8.pdf; ComponentLink4Description: Product URL; ComponentLink4URL: http://www.analog.com/en/digital-to-analog-converters/da-converters/dac8043a/products/product.html
footprint N-8 (DIP, 8-Leads, Row Spacing 7.62mm, Pitch 2.54mm, Body 9.6x6.6mm)
pins: 1 VREF (in) "DAC Reference Input Pin. Establishes DAC fullscale voltage. Constant input resistance versus code.", 2 RFB (in) "Internal Matching Feedback Resistor. Connect to external op amp output.", 3 IOUT (out) "DAC Current Output, full-scale output 1 LSB less than reference input voltage -VREF.", 4 GND (power) "Analog and Digital Ground.", 5 ~{LD} (in) "Load Strobe, Level-Sensitive Digital Input.Transfers shift-register data to DAC register while active low. See truth table for operation.", 6 SRI (in) "12-Bit Serial Register Input, data loads directly into the shift register MSB first. Extra leading bits are ignored.", 7 CLK (in) "Clock Input, positive-edge clocks data into shift register.", 8 VDD (power) "Positive Power Supply Input. Specified range of operation 5 V +/- 10%."

## DAC8043AES
designator U?
Single 12-Bit Multiplying Digital-to-Analog Converter with Serial Interface, -40 to +85 degC, R-8, Tube; Generic Part Number: DAC8043A; Manufacturer: Analog Devices; PartNumber: DAC8043AES; # DAC Outputs: 1; Max V+: 5.5V; Op Pwr Diss: 50µW; Resolution (Bits): 12; Settling Time: 250ns; Single Supply: Yes; DatasheetVersion: Rev.B; PackageVersion: 060506-A; PackageReference: R-8; PackageDescription: 8-Lead Standard Small Outline Package [SOIC_N] Narrow Body; Supplier 1: Digi-Key; Supplier Part Number 1: DAC8043AES-ND; Supplier 2: Mouser; Supplier Part Number 2: 584-DAC8043AES; Packing: Tube; RoHS: N; Mounting Technology: Surface Mount; Code_JEDEC: MS-012-AA; Code_IPC: SOIC127P600-8; ComponentLink1Description: Manufacturer URL; ComponentLink1URL: http://www.analog.com/en/index.html; ComponentLink2Description: Datasheet; ComponentLink2URL: http://www.analog.com/static/imported-files/data_sheets/DAC8043A.pdf; ComponentLink3Description: Package Specification; ComponentLink3URL: http://www.analog.com/static/imported-files/packages/PKG_PDF/SOIC_Narrow%20(R)/R_8.pdf; ComponentLink4Description: Product URL; ComponentLink4URL: http://www.analog.com/en/digital-to-analog-converters/da-converters/dac8043a/products/product.html
footprint R-8_N (SOIC, 8-Leads, Body 4.9x3.9mm, Pitch 1.27mm, IPC Medium Density)
footprint R-8_L (SOIC, 8-Leads, Body 4.9x3.9mm, Pitch 1.27mm, IPC High Density)
footprint R-8_M (SOIC, 8-Leads, Body 4.9x3.9mm, Pitch 1.27mm, IPC Low Density)
pins: 1 IOUT (out) "DAC Current Output, full-scale output 1 LSB less than reference input voltage -VREF.", 2 GND (power) "Analog and Digital Ground.", 3 ~{LD} (in) "Load Strobe, Level-Sensitive Digital Input.Transfers shift-register data to DAC register while active low. See truth table for operation.", 4 SRI (in) "12-Bit Serial Register Input, data loads directly into the shift register MSB first. Extra leading bits are ignored.", 5 CLK (in) "Clock Input, positive-edge clocks data into shift register.", 6 VDD (power) "Positive Power Supply Input. Specified range of operation 5V +/- 10%.", 7 VREF (in) "DAC Reference Input Pin. Establishes DAC fullscale voltage. Constant input resistance versus code.", 8 RFB (in) "Internal Matching Feedback Resistor. Connect to external op amp output."

## DAC8043AESZ
designator U?
Single 12-Bit Multiplying Digital-to-Analog Converter with Serial Interface, -40 to +85 degC, R-8, Pb-Free, Tube; Generic Part Number: DAC8043A; Manufacturer: Analog Devices; PartNumber: DAC8043AESZ; # DAC Outputs: 1; Max V+: 5.5V; Op Pwr Diss: 50µW; Resolution (Bits): 12; Settling Time: 250ns; Single Supply: Yes; DatasheetVersion: Rev.B; PackageVersion: 060506-A; PackageReference: R-8; PackageDescription: 8-Lead Standard Small Outline Package [SOIC_N] Narrow Body; Supplier 1: Digi-Key; Supplier Part Number 1: DAC8043AESZ-ND; Supplier 2: Newark; Supplier Part Number 2: 59K7912; Supplier 3: Mouser; Supplier Part Number 3: 584-DAC8043AESZ; Packing: Tube; RoHS: Y; Mounting Technology: Surface Mount; Code_JEDEC: MS-012-AA; Code_IPC: SOIC127P600-8; ComponentLink1Description: Manufacturer URL; ComponentLink1URL: http://www.analog.com/en/index.html; ComponentLink2Description: Datasheet; ComponentLink2URL: http://www.analog.com/static/imported-files/data_sheets/DAC8043A.pdf; ComponentLink3Description: Package Specification; ComponentLink3URL: http://www.analog.com/static/imported-files/packages/PKG_PDF/SOIC_Narrow%20(R)/R_8.pdf; ComponentLink4Description: Product URL; ComponentLink4URL: http://www.analog.com/en/digital-to-analog-converters/da-converters/dac8043a/products/product.html
footprint R-8_N (SOIC, 8-Leads, Body 4.9x3.9mm, Pitch 1.27mm, IPC Medium Density)
footprint R-8_L (SOIC, 8-Leads, Body 4.9x3.9mm, Pitch 1.27mm, IPC High Density)
footprint R-8_M (SOIC, 8-Leads, Body 4.9x3.9mm, Pitch 1.27mm, IPC Low Density)
pins: 1 IOUT (out) "DAC Current Output, full-scale output 1 LSB less than reference input voltage -VREF.", 2 GND (power) "Analog and Digital Ground.", 3 ~{LD} (in) "Load Strobe, Level-Sensitive Digital Input.Transfers shift-register data to DAC register while active low. See truth table for operation.", 4 SRI (in) "12-Bit Serial Register Input, data loads directly into the shift register MSB first. Extra leading bits are ignored.", 5 CLK (in) "Clock Input, positive-edge clocks data into shift register.", 6 VDD (power) "Positive Power Supply Input. Specified range of operation 5V +/- 10%.", 7 VREF (in) "DAC Reference Input Pin. Establishes DAC fullscale voltage. Constant input resistance versus code.", 8 RFB (in) "Internal Matching Feedback Resistor. Connect to external op amp output."

## DAC8043AFP
designator U?
Single 12-Bit Multiplying Digital-to-Analog Converter with Serial Interface, -40 to +85 degC, N-8, Tube; Generic Part Number: DAC8043A; Manufacturer: Analog Devices; PartNumber: DAC8043AFP; # DAC Outputs: 1; Max V+: 5.5V; Op Pwr Diss: 50µW; Resolution (Bits): 12; Settling Time: 250ns; Single Supply: Yes; DatasheetVersion: Rev.B; PackageVersion: 070606-A; PackageReference: N-8; PackageDescription: 8-Lead Plastic Dual In-Line Package [PDIP] Narrow Body; Supplier 1: Digi-Key; Supplier Part Number 1: DAC8043AFP-ND; Supplier 2: Mouser; Supplier Part Number 2: 584-DAC8043AFP; Packing: Tube; RoHS: N; Mounting Technology: Through Hole; Code_JEDEC: MS-001; ComponentLink1Description: Manufacturer URL; ComponentLink1URL: http://www.analog.com/en/index.html; ComponentLink2Description: Datasheet; ComponentLink2URL: http://www.analog.com/static/imported-files/data_sheets/DAC8043A.pdf; ComponentLink3Description: Package Specification; ComponentLink3URL: http://www.analog.com/static/imported-files/packages/PKG_PDF/PDIP(N)/N_8.pdf; ComponentLink4Description: Product URL; ComponentLink4URL: http://www.analog.com/en/digital-to-analog-converters/da-converters/dac8043a/products/product.html
footprint N-8 (DIP, 8-Leads, Row Spacing 7.62mm, Pitch 2.54mm, Body 9.6x6.6mm)
pins: 1 VREF (in) "DAC Reference Input Pin. Establishes DAC fullscale voltage. Constant input resistance versus code.", 2 RFB (in) "Internal Matching Feedback Resistor. Connect to external op amp output.", 3 IOUT (out) "DAC Current Output, full-scale output 1 LSB less than reference input voltage -VREF.", 4 GND (power) "Analog and Digital Ground.", 5 ~{LD} (in) "Load Strobe, Level-Sensitive Digital Input.Transfers shift-register data to DAC register while active low. See truth table for operation.", 6 SRI (in) "12-Bit Serial Register Input, data loads directly into the shift register MSB first. Extra leading bits are ignored.", 7 CLK (in) "Clock Input, positive-edge clocks data into shift register.", 8 VDD (power) "Positive Power Supply Input. Specified range of operation 5 V +/- 10%."

## DAC8043AFPZ
designator U?
Single 12-Bit Multiplying Digital-to-Analog Converter with Serial Interface, -40 to +85 degC, N-8, Pb-Free, Tube; Generic Part Number: DAC8043A; Manufacturer: Analog Devices; PartNumber: DAC8043AFPZ; # DAC Outputs: 1; Max V+: 5.5V; Op Pwr Diss: 50µW; Resolution (Bits): 12; Settling Time: 250ns; Single Supply: Yes; DatasheetVersion: Rev.B; PackageVersion: 070606-A; PackageReference: N-8; PackageDescription: 8-Lead Plastic Dual In-Line Package [PDIP] Narrow Body; Supplier 1: Digi-Key; Supplier Part Number 1: DAC8043AFPZ-ND; Supplier 2: Farnell; Supplier Part Number 2: 1438737; Supplier 3: Newark; Supplier Part Number 3: 59K7913; Supplier 4: Mouser; Supplier Part Number 4: 584-DAC8043AFPZ; Packing: Tube; RoHS: Y; Mounting Technology: Through Hole; Code_JEDEC: MS-001; ComponentLink1Description: Manufacturer URL; ComponentLink1URL: http://www.analog.com/en/index.html; ComponentLink2Description: Datasheet; ComponentLink2URL: http://www.analog.com/static/imported-files/data_sheets/DAC8043A.pdf; ComponentLink3Description: Package Specification; ComponentLink3URL: http://www.analog.com/static/imported-files/packages/PKG_PDF/PDIP(N)/N_8.pdf; ComponentLink4Description: Product URL; ComponentLink4URL: http://www.analog.com/en/digital-to-analog-converters/da-converters/dac8043a/products/product.html
footprint N-8 (DIP, 8-Leads, Row Spacing 7.62mm, Pitch 2.54mm, Body 9.6x6.6mm)
pins: 1 VREF (in) "DAC Reference Input Pin. Establishes DAC fullscale voltage. Constant input resistance versus code.", 2 RFB (in) "Internal Matching Feedback Resistor. Connect to external op amp output.", 3 IOUT (out) "DAC Current Output, full-scale output 1 LSB less than reference input voltage -VREF.", 4 GND (power) "Analog and Digital Ground.", 5 ~{LD} (in) "Load Strobe, Level-Sensitive Digital Input.Transfers shift-register data to DAC register while active low. See truth table for operation.", 6 SRI (in) "12-Bit Serial Register Input, data loads directly into the shift register MSB first. Extra leading bits are ignored.", 7 CLK (in) "Clock Input, positive-edge clocks data into shift register.", 8 VDD (power) "Positive Power Supply Input. Specified range of operation 5 V +/- 10%."

## DAC8043AFRU
designator U?
Single 12-Bit Multiplying Digital-to-Analog Converter with Serial Interface, -40 to +85 degC, RU-8, Tube; Generic Part Number: DAC8043A; Manufacturer: Analog Devices; PartNumber: DAC8043AFRU; # DAC Outputs: 1; Max V+: 5.5V; Op Pwr Diss: 50µW; Resolution (Bits): 12; Settling Time: 250ns; Single Supply: Yes; DatasheetVersion: Rev.B; PackageVersion: 1997; PackageReference: RU-8; PackageDescription: 8-Pin Thin Small Outline Package 0.65 mm Pitch; Supplier 1: Digi-Key; Supplier Part Number 1: DAC8043AFRU-ND; Supplier 2: Mouser; Supplier Part Number 2: 584-DAC8043AFRU; Packing: Tube; RoHS: N; Mounting Technology: Surface Mount; ComponentLink1Description: Manufacturer URL; ComponentLink1URL: http://www.analog.com/en/index.html; ComponentLink2Description: Datasheet; ComponentLink2URL: http://www.analog.com/static/imported-files/data_sheets/DAC8043A.pdf; ComponentLink3Description: Package Specification; ComponentLink3URL: http://www.analog.com/static/imported-files/packages/359224089841708504863856053953356548880RU08.pdf; ComponentLink4Description: Product URL; ComponentLink4URL: http://www.analog.com/en/digital-to-analog-converters/da-converters/dac8043a/products/product.html
footprint RU-8_N (TSOP, 8-Leads, Body 3x4.4mm, Pitch 0.65mm, IPC Medium Density)
footprint RU-8_L (TSOP, 8-Leads, Body 3x4.4mm, Pitch 0.65mm, IPC High Density)
footprint RU-8_M (TSOP, 8-Leads, Body 3x4.4mm, Pitch 0.65mm, IPC Low Density)
pins: 1 VREF (in) "DAC Reference Input Pin. Establishes DAC fullscale voltage. Constant input resistance versus code.", 2 RFB (in) "Internal Matching Feedback Resistor. Connect to external op amp output.", 3 IOUT (out) "DAC Current Output, full-scale output 1 LSB less than reference input voltage -VREF.", 4 GND (power) "Resets DAC register to zero condition.Active low input.", 5 ~{LD} (in) "Load Strobe, Level-Sensitive Digital Input.Transfers shift-register data to DAC register while active low. See truth table for operation.", 6 SRI (in) "12-Bit Serial Register Input, data loads directly into the shift register MSB first. Extra leading bits are ignored.", 7 CLK (in) "Clock Input, positive-edge clocks data into shift register.", 8 VDD (power) "Positive Power Supply Input. Specified range of operation 5 V +/- 10%."

## DAC8043AFRU-REEL7
designator U?
Single 12-Bit Multiplying Digital-to-Analog Converter with Serial Interface, -40 to +85 degC, RU-8, Reel; Generic Part Number: DAC8043A; Manufacturer: Analog Devices; PartNumber: DAC8043AFRU-REEL7; # DAC Outputs: 1; Max V+: 5.5V; Op Pwr Diss: 50µW; Resolution (Bits): 12; Settling Time: 250ns; Single Supply: Yes; DatasheetVersion: Rev.B; PackageVersion: 1997; PackageReference: RU-8; PackageDescription: 8-Pin Thin Small Outline Package 0.65 mm Pitch; Supplier 1: Digi-Key; Supplier Part Number 1: DAC8043AFRU-REEL7-ND; Supplier 2: Mouser; Supplier Part Number 2: 584-DAC8043AFRUR7; Packing: Reel; RoHS: N; Mounting Technology: Surface Mount; ComponentLink1Description: Manufacturer URL; ComponentLink1URL: http://www.analog.com/en/index.html; ComponentLink2Description: Datasheet; ComponentLink2URL: http://www.analog.com/static/imported-files/data_sheets/DAC8043A.pdf; ComponentLink3Description: Package Specification; ComponentLink3URL: http://www.analog.com/static/imported-files/packages/359224089841708504863856053953356548880RU08.pdf; ComponentLink4Description: Product URL; ComponentLink4URL: http://www.analog.com/en/digital-to-analog-converters/da-converters/dac8043a/products/product.html
footprint RU-8_N (TSOP, 8-Leads, Body 3x4.4mm, Pitch 0.65mm, IPC Medium Density)
footprint RU-8_L (TSOP, 8-Leads, Body 3x4.4mm, Pitch 0.65mm, IPC High Density)
footprint RU-8_M (TSOP, 8-Leads, Body 3x4.4mm, Pitch 0.65mm, IPC Low Density)
pins: 1 VREF (in) "DAC Reference Input Pin. Establishes DAC fullscale voltage. Constant input resistance versus code.", 2 RFB (in) "Internal Matching Feedback Resistor. Connect to external op amp output.", 3 IOUT (out) "DAC Current Output, full-scale output 1 LSB less than reference input voltage -VREF.", 4 GND (power) "Resets DAC register to zero condition.Active low input.", 5 ~{LD} (in) "Load Strobe, Level-Sensitive Digital Input.Transfers shift-register data to DAC register while active low. See truth table for operation.", 6 SRI (in) "12-Bit Serial Register Input, data loads directly into the shift register MSB first. Extra leading bits are ignored.", 7 CLK (in) "Clock Input, positive-edge clocks data into shift register.", 8 VDD (power) "Positive Power Supply Input. Specified range of operation 5 V +/- 10%."

## DAC8043AFRUZ
designator U?
Single 12-Bit Multiplying Digital-to-Analog Converter with Serial Interface, -40 to +85 degC, RU-8, Pb-Free, Tube; Generic Part Number: DAC8043A; Manufacturer: Analog Devices; PartNumber: DAC8043AFRUZ; # DAC Outputs: 1; Max V+: 5.5V; Op Pwr Diss: 50µW; Resolution (Bits): 12; Settling Time: 250ns; Single Supply: Yes; DatasheetVersion: Rev.B; PackageVersion: 1997; PackageReference: RU-8; PackageDescription: 8-Pin Thin Small Outline Package 0.65 mm Pitch; Supplier 1: Digi-Key; Supplier Part Number 1: DAC8043AFRUZ-ND; Supplier 2: Newark; Supplier Part Number 2: 59K7914; Supplier 3: Mouser; Supplier Part Number 3: 584-DAC8043AFRUZ; Packing: Tube; RoHS: Y; Mounting Technology: Surface Mount; ComponentLink1Description: Manufacturer URL; ComponentLink1URL: http://www.analog.com/en/index.html; ComponentLink2Description: Datasheet; ComponentLink2URL: http://www.analog.com/static/imported-files/data_sheets/DAC8043A.pdf; ComponentLink3Description: Package Specification; ComponentLink3URL: http://www.analog.com/static/imported-files/packages/359224089841708504863856053953356548880RU08.pdf; ComponentLink4Description: Product URL; ComponentLink4URL: http://www.analog.com/en/digital-to-analog-converters/da-converters/dac8043a/products/product.html
footprint RU-8_N (TSOP, 8-Leads, Body 3x4.4mm, Pitch 0.65mm, IPC Medium Density)
footprint RU-8_L (TSOP, 8-Leads, Body 3x4.4mm, Pitch 0.65mm, IPC High Density)
footprint RU-8_M (TSOP, 8-Leads, Body 3x4.4mm, Pitch 0.65mm, IPC Low Density)
pins: 1 VREF (in) "DAC Reference Input Pin. Establishes DAC fullscale voltage. Constant input resistance versus code.", 2 RFB (in) "Internal Matching Feedback Resistor. Connect to external op amp output.", 3 IOUT (out) "DAC Current Output, full-scale output 1 LSB less than reference input voltage -VREF.", 4 GND (power) "Resets DAC register to zero condition.Active low input.", 5 ~{LD} (in) "Load Strobe, Level-Sensitive Digital Input.Transfers shift-register data to DAC register while active low. See truth table for operation.", 6 SRI (in) "12-Bit Serial Register Input, data loads directly into the shift register MSB first. Extra leading bits are ignored.", 7 CLK (in) "Clock Input, positive-edge clocks data into shift register.", 8 VDD (power) "Positive Power Supply Input. Specified range of operation 5 V +/- 10%."

## DAC8043AFRUZ-REEL7
designator U?
Single 12-Bit Multiplying Digital-to-Analog Converter with Serial Interface, -40 to +85 degC, RU-8, Pb-Free, Reel; Generic Part Number: DAC8043A; Manufacturer: Analog Devices; PartNumber: DAC8043AFRUZ-REEL7; # DAC Outputs: 1; Max V+: 5.5V; Op Pwr Diss: 50µW; Resolution (Bits): 12; Settling Time: 250ns; Single Supply: Yes; DatasheetVersion: Rev.B; PackageVersion: 1997; PackageReference: RU-8; PackageDescription: 8-Pin Thin Small Outline Package 0.65 mm Pitch; Supplier 1: Digi-Key; Supplier Part Number 1: DAC8043AFRUZ-REEL7-ND; Supplier 2: Newark; Supplier Part Number 2: 59K7915; Supplier 3: Mouser; Supplier Part Number 3: 584-DAC8043AFRUZR7; Packing: Reel; RoHS: Y; Mounting Technology: Surface Mount; ComponentLink1Description: Manufacturer URL; ComponentLink1URL: http://www.analog.com/en/index.html; ComponentLink2Description: Datasheet; ComponentLink2URL: http://www.analog.com/static/imported-files/data_sheets/DAC8043A.pdf; ComponentLink3Description: Package Specification; ComponentLink3URL: http://www.analog.com/static/imported-files/packages/359224089841708504863856053953356548880RU08.pdf; ComponentLink4Description: Product URL; ComponentLink4URL: http://www.analog.com/en/digital-to-analog-converters/da-converters/dac8043a/products/product.html
footprint RU-8_N (TSOP, 8-Leads, Body 3x4.4mm, Pitch 0.65mm, IPC Medium Density)
footprint RU-8_L (TSOP, 8-Leads, Body 3x4.4mm, Pitch 0.65mm, IPC High Density)
footprint RU-8_M (TSOP, 8-Leads, Body 3x4.4mm, Pitch 0.65mm, IPC Low Density)
pins: 1 VREF (in) "DAC Reference Input Pin. Establishes DAC fullscale voltage. Constant input resistance versus code.", 2 RFB (in) "Internal Matching Feedback Resistor. Connect to external op amp output.", 3 IOUT (out) "DAC Current Output, full-scale output 1 LSB less than reference input voltage -VREF.", 4 GND (power) "Resets DAC register to zero condition.Active low input.", 5 ~{LD} (in) "Load Strobe, Level-Sensitive Digital Input.Transfers shift-register data to DAC register while active low. See truth table for operation.", 6 SRI (in) "12-Bit Serial Register Input, data loads directly into the shift register MSB first. Extra leading bits are ignored.", 7 CLK (in) "Clock Input, positive-edge clocks data into shift register.", 8 VDD (power) "Positive Power Supply Input. Specified range of operation 5 V +/- 10%."